# Altium schematic symbol library FPGA_Xilinx_Virtex7.SchLib: 34 symbols (part 12 of 34)
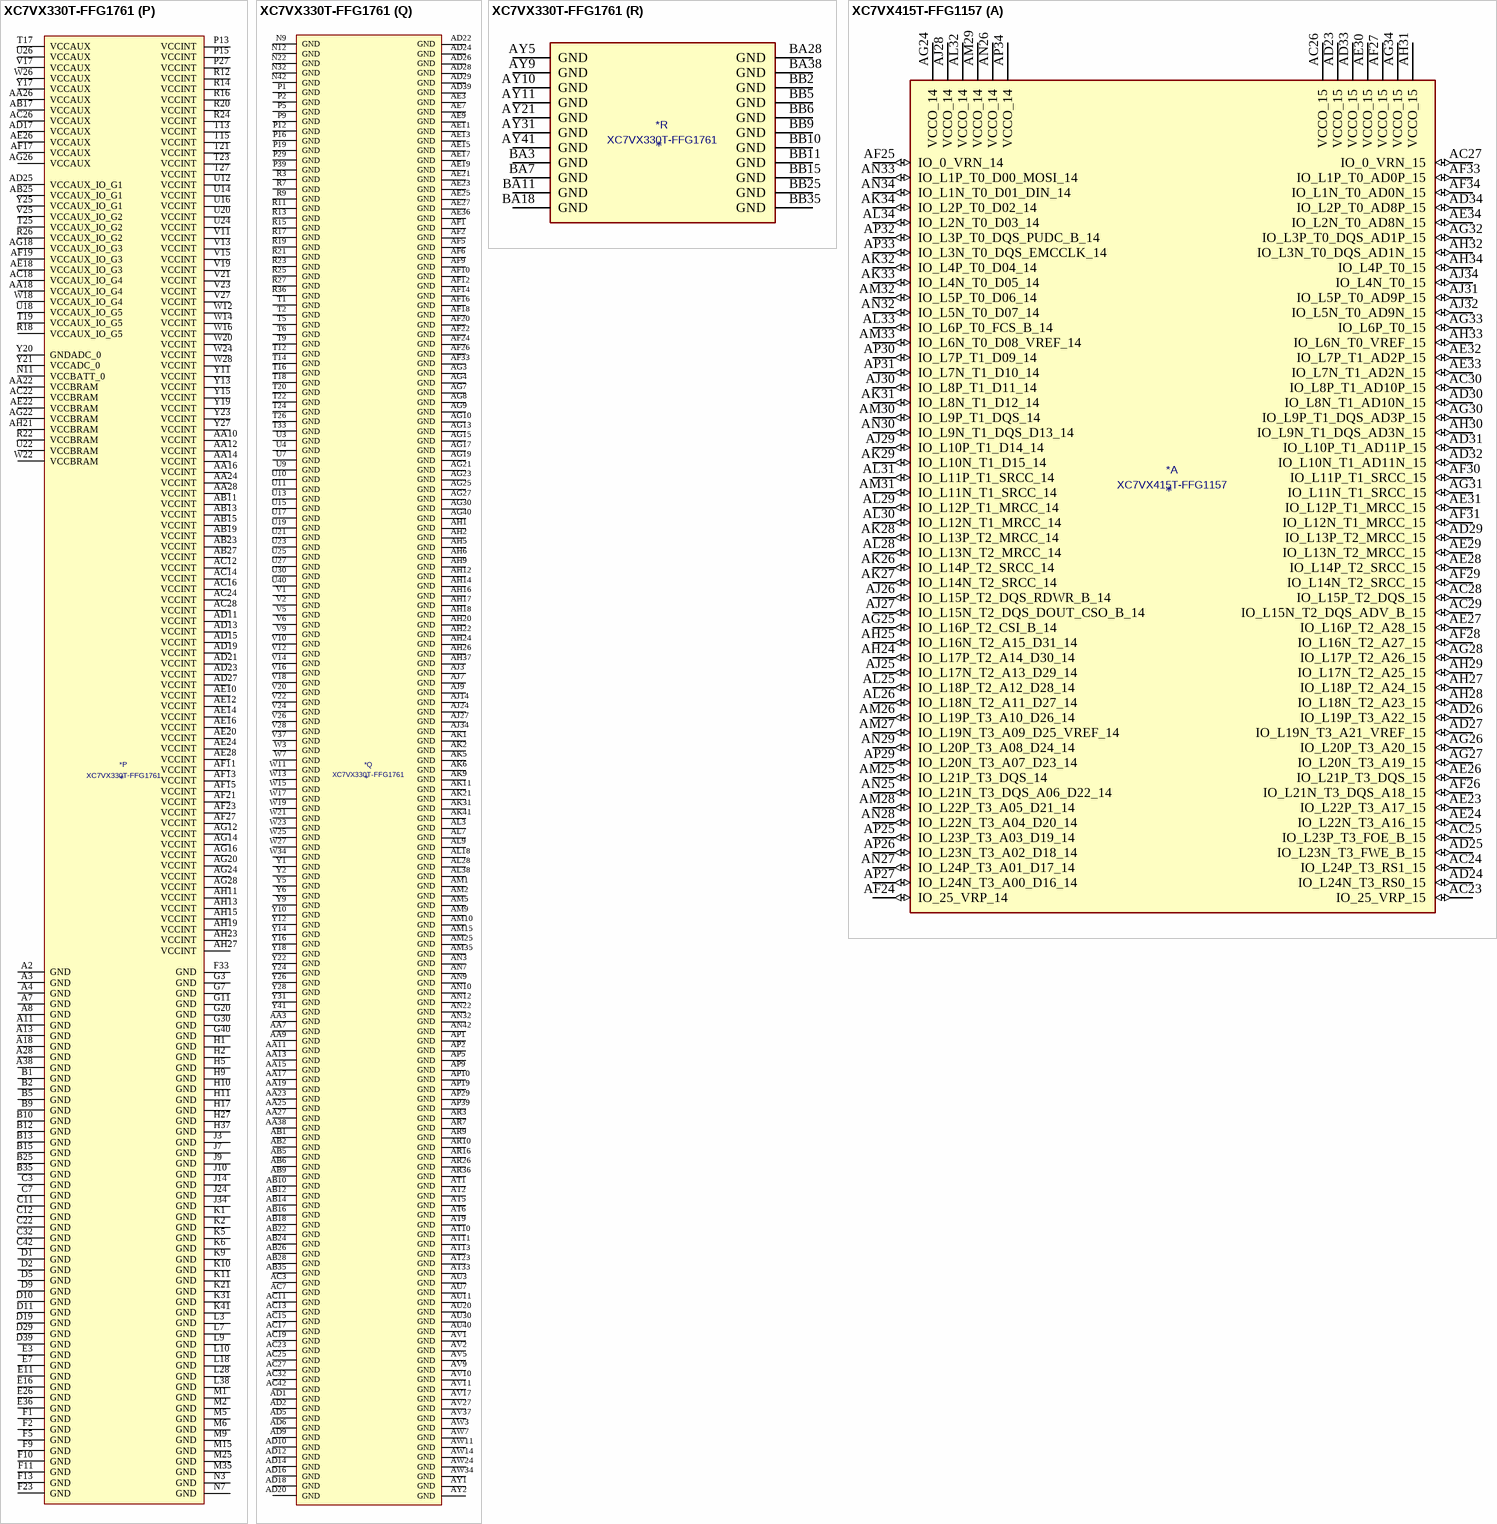
[diagram p183: symbols XC7VX330T-FFG1761 to XC7VX415T-FFG1157]

## XC7VX330T-FFG1761
designator *  value XC7VX330T-FFG1761
ki_keywords: FPGA; ki_description: Virtex 7 XT 330 XC7VX330T-FFG1761
part A pins: AK26 VCCO_12 (power), AN27 VCCO_12 (power), AN30 IO_L21P_T3_DQS_13 (io), AN31 IO_L23P_T3_13 (io), AP30 IO_L21N_T3_DQS_13 (io), AP31 IO_L23N_T3_13 (io), AP32 IO_L22P_T3_13 (io), AP33 IO_L24P_T3_13 (io), AP34 VCCO_13 (power), AR30 IO_L19P_T3_13 (io), AR31 VCCO_13 (power), AR32 IO_L22N_T3_13 (io), AR33 IO_L24N_T3_13 (io), AR34 IO_L10P_T1_13 (io), AR35 IO_0_13 (io), AT28 VCCO_12 (power), AT30 IO_L19N_T3_VREF_13 (io), AT31 IO_25_13 (io), AT32 IO_L9P_T1_DQS_13 (io), AT34 IO_L7P_T1_13 (io), AT35 IO_L10N_T1_13 (io), AT36 IO_L8P_T1_13 (io), AU25 VCCO_12 (power), AU31 IO_L20P_T3_13 (io), AU32 IO_L11P_T1_SRCC_13 (io), AU33 IO_L9N_T1_DQS_13 (io), AU34 IO_L7N_T1_13 (io), AU35 VCCO_13 (power), AU36 IO_L8N_T1_13 (io), AV30 IO_L18P_T2_13 (io), AV31 IO_L20N_T3_13 (io), AV32 VCCO_13 (power), AV33 IO_L11N_T1_SRCC_13 (io), AV34 IO_L13P_T2_MRCC_13 (io), AV35 IO_L13N_T2_MRCC_13 (io), AV36 IO_L2P_T0_13 (io), AW29 VCCO_12 (power), AW30 IO_L16P_T2_13 (io), AW31 IO_L18N_T2_13 (io), AW32 IO_L12P_T1_MRCC_13 (io), AW33 IO_L12N_T1_MRCC_13 (io), AW35 IO_L6P_T0_13 (io), AW36 IO_L2N_T0_13 (io), AY26 VCCO_12 (power), AY30 IO_L16N_T2_13 (io), AY32 IO_L14P_T2_SRCC_13 (io), AY33 IO_L14N_T2_SRCC_13 (io), AY34 IO_L1P_T0_13 (io), AY35 IO_L6N_T0_VREF_13 (io), AY36 VCCO_13 (power), BA30 IO_L17P_T2_13 (io), BA31 IO_L15P_T2_DQS_13 (io), BA32 IO_L15N_T2_DQS_13 (io), BA33 VCCO_13 (power), BA34 IO_L3P_T0_DQS_13 (io), BA35 IO_L1N_T0_13 (io), BA36 IO_L4P_T0_13 (io), BB30 VCCO_13 (power), BB31 IO_L17N_T2_13 (io), BB32 IO_L5P_T0_13 (io), BB33 IO_L5N_T0_13 (io), BB34 IO_L3N_T0_DQS_13 (io), BB36 IO_L4N_T0_13 (io)
part B pins: AF28 VCCO_14 (power), AF29 IO_L21P_T3_DQS_14 (io), AF30 IO_L23P_T3_A03_D19_14 (io), AG29 IO_L21N_T3_DQS_A06_D22_14 (io), AG31 IO_L23N_T3_A02_D18_14 (io), AG32 IO_25_VRP_14 (io), AG33 IO_L7P_T1_D09_14 (io), AH28 IO_L24P_T3_A01_D17_14 (io), AH29 IO_L19P_T3_A10_D26_14 (io), AH30 IO_L19N_T3_A09_D25_VREF_14 (io), AH31 IO_L9P_T1_DQS_14 (io), AH32 VCCO_14 (power), AH33 IO_L7N_T1_D10_14 (io), AH34 IO_L10P_T1_D14_14 (io), AH35 IO_0_VRN_14 (io), AJ28 IO_L24N_T3_A00_D16_14 (io), AJ29 VCCO_14 (power), AJ30 IO_L20P_T3_A08_D24_14 (io), AJ31 IO_L9N_T1_DQS_D13_14 (io), AJ32 IO_L13P_T2_MRCC_14 (io), AJ33 IO_L11P_T1_SRCC_14 (io), AJ35 IO_L10N_T1_D15_14 (io), AJ36 IO_L2P_T0_D02_14 (io), AJ37 IO_L2N_T0_D03_14 (io), AK28 IO_L22P_T3_A05_D21_14 (io), AK29 IO_L22N_T3_A04_D20_14 (io), AK30 IO_L20N_T3_A07_D23_14 (io), AK32 IO_L13N_T2_MRCC_14 (io), AK33 IO_L11N_T1_SRCC_14 (io), AK34 IO_L12P_T1_MRCC_14 (io), AK35 IO_L8P_T1_D11_14 (io), AK36 VCCO_14 (power), AK37 IO_L4P_T0_D04_14 (io), AL29 IO_L18P_T2_A12_D28_14 (io), AL30 IO_L18N_T2_A11_D27_14 (io), AL31 IO_L14P_T2_SRCC_14 (io), AL32 IO_L14N_T2_SRCC_14 (io), AL33 VCCO_14 (power), AL34 IO_L12N_T1_MRCC_14 (io), AL35 IO_L8N_T1_D12_14 (io), AL36 IO_L6P_T0_FCS_B_14 (io), AL37 IO_L4N_T0_D05_14 (io), AM30 VCCO_14 (power), AM31 IO_L16P_T2_CSI_B_14 (io), AM32 IO_L16N_T2_A15_D31_14 (io), AM33 IO_L17P_T2_A14_D30_14 (io), AM34 IO_L15P_T2_DQS_RDWR_B_14 (io), AM36 IO_L1P_T0_D00_MOSI_14 (io), AM37 IO_L6N_T0_D08_VREF_14 (io), AM38 IO_0_VRN_15 (io), AM39 IO_L6P_T0_15 (io), AM40 VCCO_15 (power), AM41 IO_L2P_T0_AD8P_15 (io), AM42 IO_L2N_T0_AD8N_15 (io), AN33 IO_L17N_T2_A13_D29_14 (io), AN34 IO_L15N_T2_DQS_DOUT_CSO_B_14 (io), AN35 IO_L5P_T0_D06_14 (io), AN36 IO_L1N_T0_D01_DIN_14 (io), AN37 VCCO_14 (power), AN38 IO_L1P_T0_AD0P_15 (io), AN39 IO_L6N_T0_VREF_15 (io), AN40 IO_L4P_T0_15 (io), AN41 IO_L4N_T0_15 (io), AP35 IO_L5N_T0_D07_14 (io), AP36 IO_L3P_T0_DQS_PUDC_B_14 (io), AP37 IO_L3N_T0_DQS_EMCCLK_14 (io), AP38 IO_L1N_T0_AD0N_15 (io), AP40 IO_L7P_T1_AD2P_15 (io), AP41 IO_L8P_T1_AD10P_15 (io), AP42 IO_L8N_T1_AD10N_15 (io), AR37 IO_L5P_T0_AD9P_15 (io), AR38 IO_L3P_T0_DQS_AD1P_15 (io), AR39 IO_L3N_T0_DQS_AD1N_15 (io), AR40 IO_L7N_T1_AD2N_15 (io), AR41 VCCO_15 (power), AR42 IO_L10P_T1_AD11P_15 (io), AT37 IO_L5N_T0_AD9N_15 (io), AT38 VCCO_15 (power), AT39 IO_L9P_T1_DQS_AD3P_15 (io), AT40 IO_L9N_T1_DQS_AD3N_15 (io), AT41 IO_L20P_T3_A20_15 (io), AT42 IO_L10N_T1_AD11N_15 (io), AU37 IO_25_VRP_15 (io), AU38 IO_L12P_T1_MRCC_15 (io), AU39 IO_L11P_T1_SRCC_15 (io), AU41 IO_L22P_T3_A17_15 (io), AU42 IO_L20N_T3_A19_15 (io), AV38 IO_L12N_T1_MRCC_15 (io), AV39 IO_L11N_T1_SRCC_15 (io), AV40 IO_L13P_T2_MRCC_15 (io), AV41 IO_L22N_T3_A16_15 (io), AV42 VCCO_15 (power), AW37 IO_L15P_T2_DQS_15 (io), AW38 IO_L17P_T2_A26_15 (io), AW39 VCCO_15 (power), AW40 IO_L13N_T2_MRCC_15 (io), AW41 IO_L24P_T3_RS1_15 (io), AW42 IO_L24N_T3_RS0_15 (io), AY37 IO_L15N_T2_DQS_ADV_B_15 (io), AY38 IO_L17N_T2_A25_15 (io), AY39 IO_L14P_T2_SRCC_15 (io), AY40 IO_L14N_T2_SRCC_15 (io), AY42 IO_L21P_T3_DQS_15 (io), BA37 IO_L16P_T2_A28_15 (io), BA39 IO_L19P_T3_A22_15 (io), BA40 IO_L19N_T3_A21_VREF_15 (io), BA41 IO_L23P_T3_FOE_B_15 (io), BA42 IO_L21N_T3_DQS_A18_15 (io), BB37 IO_L16N_T2_A27_15 (io), BB38 IO_L18P_T2_A24_15 (io), BB39 IO_L18N_T2_A23_15 (io), BB40 VCCO_15 (power), BB41 IO_L23N_T3_FWE_B_15 (io)
part C pins: AA29 IO_L23P_T3_16 (io), AA30 IO_L23N_T3_16 (io), AA31 IO_L21P_T3_DQS_16 (io), AA32 IO_L21N_T3_DQS_16 (io), AA33 VCCO_16 (power), AA34 IO_L10P_T1_16 (io), AA35 IO_L10N_T1_16 (io), AA36 IO_L8N_T1_16 (io), AA37 IO_L7N_T1_16 (io), AA39 IO_L3N_T0_DQS_17 (io), AA40 IO_L6P_T0_17 (io), AA41 IO_L6N_T0_VREF_17 (io), AA42 IO_L4N_T0_17 (io), AB29 IO_L24P_T3_16 (io), AB30 VCCO_16 (power), AB31 IO_L11P_T1_SRCC_16 (io), AB32 IO_L11N_T1_SRCC_16 (io), AB33 IO_L12P_T1_MRCC_16 (io), AB34 IO_25_VRP_16 (io), AB36 IO_L9P_T1_DQS_16 (io), AB37 IO_L9N_T1_DQS_16 (io), AB38 IO_L5P_T0_17 (io), AB39 IO_L5N_T0_17 (io), AB40 VCCO_17 (power), AB41 IO_L1P_T0_17 (io), AB42 IO_L1N_T0_17 (io), AC29 IO_L24N_T3_16 (io), AC30 IO_L22P_T3_16 (io), AC31 IO_L20P_T3_16 (io), AC33 IO_L12N_T1_MRCC_16 (io), AC34 IO_L14P_T2_SRCC_16 (io), AC35 IO_L5P_T0_16 (io), AC36 IO_L5N_T0_16 (io), AC37 VCCO_17 (power), AC38 IO_L7P_T1_17 (io), AC39 IO_L7N_T1_17 (io), AC40 IO_L10P_T1_17 (io), AC41 IO_L10N_T1_17 (io), AD30 IO_L22N_T3_16 (io), AD31 IO_L20N_T3_16 (io), AD32 IO_L13P_T2_MRCC_16 (io), AD33 IO_L13N_T2_MRCC_16 (io), AD34 VCCO_16 (power), AD35 IO_L14N_T2_SRCC_16 (io), AD36 IO_L4P_T0_16 (io), AD37 IO_L4N_T0_16 (io), AD38 IO_L9P_T1_DQS_17 (io), AD40 IO_L12P_T1_MRCC_17 (io), AD41 IO_L12N_T1_MRCC_17 (io), AD42 IO_L8P_T1_17 (io), AE29 IO_L18P_T2_16 (io), AE30 IO_L18N_T2_16 (io), AE31 VCCO_16 (power), AE32 IO_L15P_T2_DQS_16 (io), AE33 IO_L15N_T2_DQS_16 (io), AE34 IO_L17P_T2_16 (io), AE35 IO_L17N_T2_16 (io), AE37 IO_L2P_T0_16 (io), AE38 IO_L9N_T1_DQS_17 (io), AE39 IO_L11P_T1_SRCC_17 (io), AE40 IO_L11N_T1_SRCC_17 (io), AE41 VCCO_17 (power), AE42 IO_L8N_T1_17 (io), AF31 IO_L16P_T2_16 (io), AF32 IO_L16N_T2_16 (io), AF34 IO_L3P_T0_DQS_16 (io), AF35 IO_L1P_T0_16 (io), AF36 IO_L1N_T0_16 (io), AF37 IO_L2N_T0_16 (io), AF38 VCCO_17 (power), AF39 IO_L13P_T2_MRCC_17 (io), AF40 IO_L13N_T2_MRCC_17 (io), AF41 IO_L14P_T2_SRCC_17 (io), AF42 IO_L16P_T2_17 (io), AG34 IO_L3N_T0_DQS_16 (io), AG35 VCCO_16 (power), AG36 IO_L6P_T0_16 (io), AG37 IO_25_VRP_17 (io), AG38 IO_L17P_T2_17 (io), AG39 IO_L15P_T2_DQS_17 (io), AG41 IO_L14N_T2_SRCC_17 (io), AG42 IO_L16N_T2_17 (io), AH36 IO_L6N_T0_VREF_16 (io), AH38 IO_L17N_T2_17 (io), AH39 IO_L15N_T2_DQS_17 (io), AH40 IO_L20P_T3_17 (io), AH41 IO_L20N_T3_17 (io), AH42 VCCO_17 (power), AJ38 IO_L18P_T2_17 (io), AJ39 VCCO_17 (power), AJ40 IO_L22P_T3_17 (io), AJ41 IO_L22N_T3_17 (io), AJ42 IO_L24P_T3_17 (io), AK38 IO_L18N_T2_17 (io), AK39 IO_L23P_T3_17 (io), AK40 IO_L19P_T3_17 (io), AK42 IO_L24N_T3_17 (io), AL39 IO_L23N_T3_17 (io), AL40 IO_L19N_T3_VREF_17 (io), AL41 IO_L21P_T3_DQS_17 (io), AL42 IO_L21N_T3_DQS_17 (io), W40 IO_L2P_T0_17 (io), Y32 IO_L19P_T3_16 (io), Y33 IO_L19N_T3_VREF_16 (io), Y34 IO_0_VRN_16 (io), Y35 IO_L8P_T1_16 (io), Y36 VCCO_16 (power), Y37 IO_L7P_T1_16 (io), Y38 IO_0_VRN_17 (io), Y39 IO_L3P_T0_DQS_17 (io), Y40 IO_L2N_T0_17 (io), Y42 IO_L4P_T0_17 (io)
part D pins: A40 IO_L2P_T0_19 (io), A41 IO_L2N_T0_19 (io), B40 VCCO_19 (power), B41 IO_L4P_T0_19 (io), B42 IO_L4N_T0_19 (io), C40 IO_L6P_T0_19 (io), C41 IO_L6N_T0_VREF_19 (io), D40 IO_L1N_T0_19 (io), D41 IO_L3P_T0_DQS_19 (io), D42 IO_L3N_T0_DQS_19 (io), E40 IO_L1P_T0_19 (io), E41 VCCO_19 (power), E42 IO_L5N_T0_19 (io), F40 IO_L10P_T1_19 (io), F41 IO_L10N_T1_19 (io), F42 IO_L5P_T0_19 (io), G39 IO_L8N_T1_19 (io), G41 IO_L9P_T1_DQS_19 (io), G42 IO_L9N_T1_DQS_19 (io), H39 IO_L8P_T1_19 (io), H40 IO_L7P_T1_19 (io), H41 IO_L7N_T1_19 (io), H42 VCCO_19 (power), J39 VCCO_19 (power), J40 IO_L11P_T1_SRCC_19 (io), J41 IO_L11N_T1_SRCC_19 (io), J42 IO_L15N_T2_DQS_19 (io), K37 IO_L17P_T2_19 (io), K38 IO_L17N_T2_19 (io), K39 IO_L12P_T1_MRCC_19 (io), K40 IO_L12N_T1_MRCC_19 (io), K42 IO_L15P_T2_DQS_19 (io), L36 IO_0_VRN_19 (io), L37 IO_L18N_T2_19 (io), L39 IO_L13P_T2_MRCC_19 (io), L40 IO_L13N_T2_MRCC_19 (io), L41 IO_L14N_T2_SRCC_19 (io), L42 IO_L16N_T2_19 (io), M36 IO_L18P_T2_19 (io), M37 IO_L20P_T3_19 (io), M38 IO_L20N_T3_19 (io), M39 IO_L22N_T3_19 (io), M40 VCCO_19 (power), M41 IO_L14P_T2_SRCC_19 (io), M42 IO_L16P_T2_19 (io), N33 IO_L2P_T0_18 (io), N34 IO_L2N_T0_18 (io), N35 IO_0_VRN_18 (io), N36 IO_25_VRP_19 (io), N37 VCCO_19 (power), N38 IO_L22P_T3_19 (io), N39 IO_L24P_T3_19 (io), N40 IO_L24N_T3_19 (io), N41 IO_L19N_T3_VREF_19 (io), P32 IO_L6P_T0_18 (io), P33 IO_L6N_T0_VREF_18 (io), P34 VCCO_18 (power), P35 IO_L4P_T0_18 (io), P36 IO_L4N_T0_18 (io), P37 IO_L8P_T1_18 (io), P38 IO_L8N_T1_18 (io), P40 IO_L23N_T3_19 (io), P41 IO_L19P_T3_19 (io), P42 IO_L21N_T3_DQS_19 (io), R32 IO_L5N_T0_18 (io), R33 IO_L3P_T0_DQS_18 (io), R34 IO_L3N_T0_DQS_18 (io), R35 IO_L1N_T0_18 (io), R37 IO_L7N_T1_18 (io), R38 IO_L10P_T1_18 (io), R39 IO_L10N_T1_18 (io), R40 IO_L23P_T3_19 (io), R41 VCCO_19 (power), R42 IO_L21P_T3_DQS_19 (io), T32 IO_L5P_T0_18 (io), T34 IO_L1P_T0_18 (io), T35 IO_L9N_T1_DQS_18 (io), T36 IO_L7P_T1_18 (io), T37 IO_L13N_T2_MRCC_18 (io), T38 VCCO_18 (power), T39 IO_L12N_T1_MRCC_18 (io), T40 IO_L20P_T3_18 (io), T41 IO_L20N_T3_18 (io), T42 IO_L22N_T3_18 (io), U32 IO_L17P_T2_18 (io), U33 IO_L17N_T2_18 (io), U34 IO_L9P_T1_DQS_18 (io), U35 VCCO_18 (power), U36 IO_L13P_T2_MRCC_18 (io), U37 IO_L11P_T1_SRCC_18 (io), U38 IO_L11N_T1_SRCC_18 (io), U39 IO_L12P_T1_MRCC_18 (io), U41 IO_L22P_T3_18 (io), U42 IO_L24N_T3_18 (io), V32 VCCO_18 (power), V33 IO_L15P_T2_DQS_18 (io), V34 IO_L15N_T2_DQS_18 (io), V35 IO_L14P_T2_SRCC_18 (io), V36 IO_L14N_T2_SRCC_18 (io), V38 IO_L23N_T3_18 (io), V39 IO_L19P_T3_18 (io), V40 IO_L19N_T3_VREF_18 (io), V41 IO_L24P_T3_18 (io), V42 VCCO_18 (power), W32 IO_L18P_T2_18 (io), W33 IO_L18N_T2_18 (io), W35 IO_25_VRP_18 (io), W36 IO_L16P_T2_18 (io), W37 IO_L16N_T2_18 (io), W38 IO_L23P_T3_18 (io), W39 VCCO_18 (power), W41 IO_L21P_T3_DQS_18 (io), W42 IO_L21N_T3_DQS_18 (io)
part E pins: AJ19 VCCO_32 (power), AK16 VCCO_31 (power), AL13 VCCO_31 (power), AN17 VCCO_32 (power), AP14 VCCO_31 (power), AR11 VCCO_31 (power), AT18 VCCO_32 (power), AU15 VCCO_31 (power), AV12 VCCO_31 (power), AW19 VCCO_32 (power), AY16 VCCO_32 (power), BA13 VCCO_31 (power), BB20 VCCO_32 (power)
part F pins: AJ20 IO_L5N_T0_33 (io), AJ21 IO_L5P_T0_33 (io), AJ22 IO_L3P_T0_DQS_33 (io), AJ23 IO_L1P_T0_33 (io), AK20 IO_L2P_T0_33 (io), AK22 IO_L3N_T0_DQS_33 (io), AK23 IO_L1N_T0_33 (io), AL20 IO_L2N_T0_33 (io), AL21 IO_L4P_T0_33 (io), AL22 IO_L6P_T0_33 (io), AL23 VCCO_33 (power), AL24 IO_0_VRN_33 (io), AM20 VCCO_33 (power), AM21 IO_L4N_T0_33 (io), AM22 IO_L6N_T0_VREF_33 (io), AM23 IO_L8P_T1_33 (io), AM24 IO_L7P_T1_33 (io), AN20 IO_25_VRP_33 (io), AN21 IO_L10P_T1_33 (io), AN23 IO_L8N_T1_33 (io), AN24 IO_L7N_T1_33 (io), AP21 IO_L10N_T1_33 (io), AP22 IO_L9N_T1_DQS_33 (io), AP23 IO_L9P_T1_DQS_33 (io), AP24 VCCO_33 (power), AR21 VCCO_33 (power), AR22 IO_L11N_T1_SRCC_33 (io), AR23 IO_L11P_T1_SRCC_33 (io), AR24 IO_L16P_T2_33 (io), AT21 IO_L15P_T2_DQS_33 (io), AT22 IO_L12P_T1_MRCC_33 (io), AT24 IO_L16N_T2_33 (io), AU21 IO_L15N_T2_DQS_33 (io), AU22 IO_L12N_T1_MRCC_33 (io), AU23 IO_L13P_T2_MRCC_33 (io), AU24 IO_L18P_T2_33 (io), AV21 IO_L17P_T2_33 (io), AV22 VCCO_33 (power), AV23 IO_L13N_T2_MRCC_33 (io), AV24 IO_L18N_T2_33 (io), AW21 IO_L17N_T2_33 (io), AW22 IO_L14N_T2_SRCC_33 (io), AW23 IO_L14P_T2_SRCC_33 (io), AY22 IO_L19N_T3_VREF_33 (io), AY23 IO_L19P_T3_33 (io), AY24 IO_L22P_T3_33 (io), AY25 IO_L20P_T3_33 (io), BA21 IO_L23P_T3_33 (io), BA22 IO_L21P_T3_DQS_33 (io), BA23 VCCO_33 (power), BA24 IO_L22N_T3_33 (io), BA25 IO_L20N_T3_33 (io), BB21 IO_L23N_T3_33 (io), BB22 IO_L21N_T3_DQS_33 (io), BB23 IO_L24N_T3_33 (io), BB24 IO_L24P_T3_33 (io), H30 IO_L8N_T1_34 (io), H31 IO_L10N_T1_34 (io), H32 VCCO_34 (power), H34 IO_L6P_T0_34 (io), H35 IO_L6N_T0_VREF_34 (io), J30 IO_L8P_T1_34 (io), J31 IO_L10P_T1_34 (io), J32 IO_L2P_T0_34 (io), J33 IO_L2N_T0_34 (io), J35 IO_L1N_T0_34 (io), K29 IO_L7P_T1_34 (io), K30 IO_L7N_T1_34 (io), K32 IO_L12N_T1_MRCC_34 (io), K33 IO_L3P_T0_DQS_34 (io), K34 IO_L3N_T0_DQS_34 (io), K35 IO_L1P_T0_34 (io), L29 IO_L9P_T1_DQS_34 (io), L30 IO_L9N_T1_DQS_34 (io), L31 IO_L12P_T1_MRCC_34 (io), L32 IO_L11N_T1_SRCC_34 (io), L33 VCCO_34 (power), L34 IO_L4P_T0_34 (io), L35 IO_L4N_T0_34 (io), M28 IO_L15P_T2_DQS_34 (io), M29 IO_L15N_T2_DQS_34 (io), M30 VCCO_34 (power), M31 IO_L13N_T2_MRCC_34 (io), M32 IO_L11P_T1_SRCC_34 (io), M33 IO_L5P_T0_34 (io), M34 IO_L5N_T0_34 (io), N28 IO_L17P_T2_34 (io), N29 IO_L17N_T2_34 (io), N30 IO_L13P_T2_MRCC_34 (io), N31 IO_L14N_T2_SRCC_34 (io), P28 IO_L16N_T2_34 (io), P30 IO_L14P_T2_SRCC_34 (io), P31 IO_L18N_T2_34 (io), R28 IO_L16P_T2_34 (io), R29 IO_0_VRN_34 (io), R30 IO_L18P_T2_34 (io), R31 VCCO_34 (power), T28 VCCO_34 (power), T29 IO_L21P_T3_DQS_34 (io), T30 IO_L21N_T3_DQS_34 (io), T31 IO_L19N_T3_VREF_34 (io), U28 IO_25_VRP_34 (io), U29 IO_L23N_T3_34 (io), U31 IO_L19P_T3_34 (io), V29 IO_L23P_T3_34 (io), V30 IO_L20P_T3_34 (io), V31 IO_L20N_T3_34 (io), W29 VCCO_34 (power), W30 IO_L22P_T3_34 (io), W31 IO_L22N_T3_34 (io), Y29 IO_L24P_T3_34 (io), Y30 IO_L24N_T3_34 (io)
part G pins: A33 VCCO_35 (power), A34 IO_L2N_T0_AD12N_35 (io), A35 IO_L4P_T0_35 (io), A36 IO_L4N_T0_35 (io), A37 IO_L1N_T0_AD4N_35 (io), A39 IO_L3N_T0_DQS_AD5N_35 (io), B32 IO_L8P_T1_AD14P_35 (io), B33 IO_L8N_T1_AD14N_35 (io), B34 IO_L2P_T0_AD12P_35 (io), B36 IO_L1P_T0_AD4P_35 (io), B37 IO_L6P_T0_35 (io), B38 IO_L6N_T0_VREF_35 (io), B39 IO_L3P_T0_DQS_AD5P_35 (io), C33 IO_L10P_T1_AD15P_35 (io), C34 IO_L10N_T1_AD15N_35 (io), C35 IO_L12P_T1_MRCC_35 (io), C36 IO_L12N_T1_MRCC_35 (io), C37 VCCO_35 (power), C38 IO_L5P_T0_AD13P_35 (io), C39 IO_L5N_T0_AD13N_35 (io), D32 IO_L7N_T1_AD6N_35 (io), D33 IO_L9N_T1_DQS_AD7N_35 (io), D34 VCCO_35 (power), D35 IO_L11P_T1_SRCC_35 (io), D36 IO_L11N_T1_SRCC_35 (io), D37 IO_L14P_T2_SRCC_35 (io), D38 IO_L14N_T2_SRCC_35 (io), E31 VCCO_35 (power), E32 IO_L7P_T1_AD6P_35 (io), E33 IO_L9P_T1_DQS_AD7P_35 (io), E34 IO_L13P_T2_MRCC_35 (io), E35 IO_L13N_T2_MRCC_35 (io), E37 IO_L19P_T3_35 (io), E38 IO_L19N_T3_VREF_35 (io), E39 IO_L21N_T3_DQS_35 (io), F32 IO_L15N_T2_DQS_35 (io), F34 IO_L17P_T2_35 (io), F35 IO_L17N_T2_35 (io), F36 IO_L16P_T2_35 (io), F37 IO_L16N_T2_35 (io), F38 VCCO_35 (power), F39 IO_L21P_T3_DQS_35 (io), G21 IO_L4P_T0_36 (io), G22 IO_L4N_T0_36 (io), G23 IO_L6N_T0_VREF_36 (io), G24 IO_L1N_T0_36 (io), G25 VCCO_36 (power), G26 IO_L5P_T0_36 (io), G27 IO_L5N_T0_36 (io), G28 IO_L7P_T1_36 (io), G29 IO_L7N_T1_36 (io), G31 IO_0_VRN_35 (io), G32 IO_L15P_T2_DQS_35 (io), G33 IO_L18N_T2_35 (io), G34 IO_25_VRP_35 (io), G35 VCCO_35 (power), G36 IO_L20P_T3_35 (io), G37 IO_L20N_T3_35 (io), G38 IO_L23N_T3_35 (io), H21 IO_L2N_T0_36 (io), H22 VCCO_36 (power), H23 IO_L6P_T0_36 (io), H24 IO_L1P_T0_36 (io), H25 IO_L3P_T0_DQS_36 (io), H26 IO_L3N_T0_DQS_36 (io), H28 IO_L9P_T1_DQS_36 (io), H29 IO_L9N_T1_DQS_36 (io), H33 IO_L18P_T2_35 (io), H36 IO_L24N_T3_35 (io), H38 IO_L23P_T3_35 (io), J21 IO_L2P_T0_36 (io), J22 IO_L17N_T2_36 (io), J23 IO_L14N_T2_SRCC_36 (io), J25 IO_L12P_T1_MRCC_36 (io), J26 IO_L12N_T1_MRCC_36 (io), J27 IO_L10N_T1_36 (io), J28 IO_L8N_T1_36 (io), J29 VCCO_36 (power), J36 IO_L24P_T3_35 (io), J37 IO_L22P_T3_35 (io), J38 IO_L22N_T3_35 (io), K22 IO_L17P_T2_36 (io), K23 IO_L14P_T2_SRCC_36 (io), K24 IO_L11P_T1_SRCC_36 (io), K25 IO_L11N_T1_SRCC_36 (io), K26 VCCO_36 (power), K27 IO_L10P_T1_36 (io), K28 IO_L8P_T1_36 (io), K36 VCCO_35 (power), L21 IO_L18N_T2_36 (io), L22 IO_L15N_T2_DQS_36 (io), L23 VCCO_36 (power), L24 IO_L13N_T2_MRCC_36 (io), L25 IO_L16P_T2_36 (io), L26 IO_L16N_T2_36 (io), L27 IO_L24N_T3_36 (io), M21 IO_L18P_T2_36 (io), M22 IO_L15P_T2_DQS_36 (io), M23 IO_0_VRN_36 (io), M24 IO_L13P_T2_MRCC_36 (io), M26 IO_25_VRP_36 (io), M27 IO_L24P_T3_36 (io), N21 IO_L19N_T3_VREF_36 (io), N23 IO_L23P_T3_36 (io), N24 IO_L23N_T3_36 (io), N25 IO_L22P_T3_36 (io), N26 IO_L22N_T3_36 (io), N27 VCCO_36 (power), P21 IO_L19P_T3_36 (io), P22 IO_L21P_T3_DQS_36 (io), P23 IO_L21N_T3_DQS_36 (io), P24 VCCO_36 (power), P25 IO_L20P_T3_36 (io), P26 IO_L20N_T3_36 (io)
part H pins: A15 IO_L2N_T0_38 (io), A16 IO_L2P_T0_38 (io), A17 IO_L4N_T0_38 (io), A19 IO_L3N_T0_DQS_38 (io), A20 IO_L3P_T0_DQS_38 (io), A21 IO_L5N_T0_38 (io), A22 IO_L2N_T0_37 (io), A23 VCCO_37 (power), A24 IO_L1P_T0_37 (io), A25 IO_L1N_T0_37 (io), A26 IO_L3P_T0_DQS_37 (io), A27 IO_L3N_T0_DQS_37 (io), A29 IO_L17P_T2_37 (io), A30 IO_L17N_T2_37 (io), A31 IO_L16P_T2_37 (io), A32 IO_L16N_T2_37 (io), B17 IO_L4P_T0_38 (io), B18 IO_L6N_T0_VREF_38 (io), B19 IO_L1N_T0_38 (io), B20 VCCO_38 (power), B21 IO_L5P_T0_38 (io), B22 IO_L2P_T0_37 (io), B23 IO_L4N_T0_37 (io), B24 IO_L6N_T0_VREF_37 (io), B26 IO_L5P_T0_37 (io), B27 IO_L5N_T0_37 (io), B28 IO_L15P_T2_DQS_37 (io), B29 IO_L15N_T2_DQS_37 (io), B30 VCCO_37 (power), B31 IO_L18N_T2_37 (io), C17 VCCO_38 (power), C18 IO_L6P_T0_38 (io), C19 IO_L1P_T0_38 (io), C20 IO_L7N_T1_38 (io), C21 IO_L9N_T1_DQS_38 (io), C23 IO_L4P_T0_37 (io), C24 IO_L6P_T0_37 (io), C25 IO_L12P_T1_MRCC_37 (io), C26 IO_L12N_T1_MRCC_37 (io), C27 VCCO_37 (power), C28 IO_L14P_T2_SRCC_37 (io), C29 IO_L14N_T2_SRCC_37 (io), C30 IO_L20N_T3_37 (io), C31 IO_L18P_T2_37 (io), D17 IO_L10N_T1_38 (io), D18 IO_L10P_T1_38 (io), D20 IO_L7P_T1_38 (io), D21 IO_L9P_T1_DQS_38 (io), D22 IO_L10P_T1_37 (io), D23 IO_L10N_T1_37 (io), D24 VCCO_37 (power), D25 IO_L11P_T1_SRCC_37 (io), D26 IO_L11N_T1_SRCC_37 (io), D27 IO_L13P_T2_MRCC_37 (io), D28 IO_L13N_T2_MRCC_37 (io), D30 IO_L20P_T3_37 (io), D31 IO_L19N_T3_VREF_37 (io), E17 IO_L8N_T1_38 (io), E18 IO_L12N_T1_MRCC_38 (io), E19 IO_L12P_T1_MRCC_38 (io), E20 IO_L15N_T2_DQS_38 (io), E21 VCCO_37 (power), E22 IO_L8N_T1_37 (io), E23 IO_L7P_T1_37 (io), E24 IO_L7N_T1_37 (io), E25 IO_L9N_T1_DQS_37 (io), E27 IO_L21P_T3_DQS_37 (io), E28 IO_L21N_T3_DQS_37 (io), E29 IO_L22N_T3_37 (io), E30 IO_L19P_T3_37 (io), F17 IO_L8P_T1_38 (io), F18 VCCO_38 (power), F19 IO_L11N_T1_SRCC_38 (io), F20 IO_L15P_T2_DQS_38 (io), F21 IO_0_VRN_37 (io), F22 IO_L8P_T1_37 (io), F24 IO_25_VRP_37 (io), F25 IO_L9P_T1_DQS_37 (io), F26 IO_L23P_T3_37 (io), F27 IO_L23N_T3_37 (io), F28 VCCO_37 (power), F29 IO_L22P_T3_37 (io), F30 IO_L24P_T3_37 (io), F31 IO_L24N_T3_37 (io), G17 IO_L18N_T2_38 (io), G18 IO_L13N_T2_MRCC_38 (io), G19 IO_L11P_T1_SRCC_38 (io), H18 IO_L18P_T2_38 (io), H19 IO_L13P_T2_MRCC_38 (io), H20 IO_L17N_T2_38 (io), J17 IO_L16N_T2_38 (io), J18 IO_L14N_T2_SRCC_38 (io), J19 VCCO_38 (power), J20 IO_L17P_T2_38 (io), K17 IO_L16P_T2_38 (io), K18 IO_0_VRN_38 (io), K19 IO_L14P_T2_SRCC_38 (io), K20 IO_25_VRP_38 (io), L17 IO_L20N_T3_38 (io), L19 IO_L24N_T3_38 (io), L20 IO_L24P_T3_38 (io), M17 IO_L20P_T3_38 (io), M18 IO_L22N_T3_38 (io), M19 IO_L22P_T3_38 (io), M20 VCCO_38 (power), N17 VCCO_38 (power), N18 IO_L21N_T3_DQS_38 (io), N19 IO_L21P_T3_DQS_38 (io), N20 IO_L23N_T3_38 (io), P17 IO_L19N_T3_VREF_38 (io), P18 IO_L19P_T3_38 (io), P20 IO_L23P_T3_38 (io)
part I pins: A14 IO_L2N_T0_39 (io), B14 IO_L2P_T0_39 (io), B16 IO_L1N_T0_39 (io), C13 IO_L4N_T0_39 (io), C14 IO_L3N_T0_DQS_39 (io), C15 IO_L3P_T0_DQS_39 (io), C16 IO_L1P_T0_39 (io), D12 IO_L6N_T0_VREF_39 (io), D13 IO_L4P_T0_39 (io), D14 VCCO_39 (power), D15 IO_L5N_T0_39 (io), D16 IO_L5P_T0_39 (io), E12 IO_L6P_T0_39 (io), E13 IO_L8N_T1_39 (io), E14 IO_L8P_T1_39 (io), E15 IO_L7N_T1_39 (io), F12 IO_L10N_T1_39 (io), F14 IO_L11N_T1_SRCC_39 (io), F15 IO_L11P_T1_SRCC_39 (io), F16 IO_L7P_T1_39 (io), G12 IO_L10P_T1_39 (io), G13 IO_L12N_T1_MRCC_39 (io), G14 IO_L12P_T1_MRCC_39 (io), G15 VCCO_39 (power), G16 IO_L9N_T1_DQS_39 (io), H12 VCCO_39 (power), H13 IO_L14N_T2_SRCC_39 (io), H14 IO_L13N_T2_MRCC_39 (io), H15 IO_L13P_T2_MRCC_39 (io), H16 IO_L9P_T1_DQS_39 (io), J11 IO_25_VRP_39 (io), J12 IO_L15N_T2_DQS_39 (io), J13 IO_L14P_T2_SRCC_39 (io), J15 IO_L16N_T2_39 (io), J16 IO_0_VRN_39 (io), K12 IO_L15P_T2_DQS_39 (io), K13 IO_L17N_T2_39 (io), K14 IO_L17P_T2_39 (io), K15 IO_L16P_T2_39 (io), K16 VCCO_39 (power), L11 IO_L19N_T3_VREF_39 (io), L12 IO_L19P_T3_39 (io), L13 VCCO_39 (power), L14 IO_L20N_T3_39 (io), L15 IO_L18N_T2_39 (io), L16 IO_L18P_T2_39 (io), M11 IO_L24N_T3_39 (io), M12 IO_L24P_T3_39 (io), M13 IO_L22N_T3_39 (io), M14 IO_L20P_T3_39 (io), M16 IO_L21N_T3_DQS_39 (io), N13 IO_L22P_T3_39 (io), N14 IO_L23N_T3_39 (io), N15 IO_L23P_T3_39 (io), N16 IO_L21P_T3_DQS_39 (io), P14 VCCO_39 (power)
part J pins: AD3 MGTHRXN3_114 (io), AD4 MGTHRXP3_114 (io), AD7 MGTREFCLK0N_114 (io), AD8 MGTREFCLK0P_114 (io), AE5 MGTHRXN2_114 (io), AE6 MGTHRXP2_114 (io), AF3 MGTHRXN1_114 (io), AF4 MGTHRXP1_114 (io), AF7 MGTREFCLK1N_114 (io), AF8 MGTREFCLK1P_114 (io), AG1 MGTHTXN3_114 (io), AG2 MGTHTXP3_114 (io), AG5 MGTHRXN0_114 (io), AG6 MGTHRXP0_114 (io), AH3 MGTHTXN2_114 (io), AH4 MGTHTXP2_114 (io), AH7 MGTREFCLK0N_113 (io), AH8 MGTREFCLK0P_113 (io), AJ1 MGTHTXN1_114 (io), AJ2 MGTHTXP1_114 (io), AJ5 MGTHRXN3_113 (io), AJ6 MGTHRXP3_113 (io), AK3 MGTHTXN0_114 (io), AK4 MGTHTXP0_114 (io), AK7 MGTREFCLK1N_113 (io), AK8 MGTREFCLK1P_113 (io), AL1 MGTHTXN3_113 (io), AL2 MGTHTXP3_113 (io), AL5 MGTHRXN2_113 (io), AL6 MGTHRXP2_113 (io), AM3 MGTHTXN2_113 (io), AM4 MGTHTXP2_113 (io), AM7 MGTHRXN1_113 (io), AM8 MGTHRXP1_113 (io), AN1 MGTHTXN1_113 (io), AN2 MGTHTXP1_113 (io), AN5 MGTHRXN0_113 (io), AN6 MGTHRXP0_113 (io), AP3 MGTHTXN0_113 (io), AP4 MGTHTXP0_113 (io)
part K pins: AA1 MGTHTXN2_115 (io), AA2 MGTHTXP2_115 (io), AA5 MGTHRXN2_115 (io), AA6 MGTHRXP2_115 (io), AB3 MGTHRXN1_115 (io), AB4 MGTHRXP1_115 (io), AB7 MGTREFCLK1N_115 (io), AB8 MGTREFCLK1P_115 (io), AC1 MGTHTXN1_115 (io), AC2 MGTHTXP1_115 (io), AC5 MGTHRXN0_115 (io), AC6 MGTHRXP0_115 (io), AE1 MGTHTXN0_115 (io), AE2 MGTHTXP0_115 (io), P3 MGTHTXN3_116 (io), P4 MGTHTXP3_116 (io), R1 MGTHTXN2_116 (io), R2 MGTHTXP2_116 (io), R5 MGTHRXN3_116 (io), R6 MGTHRXP3_116 (io), T3 MGTHTXN1_116 (io), T4 MGTHTXP1_116 (io), T7 MGTREFCLK0N_116 (io), T8 MGTREFCLK0P_116 (io), U1 MGTHTXN0_116 (io), U2 MGTHTXP0_116 (io), U5 MGTHRXN2_116 (io), U6 MGTHRXP2_116 (io), V3 MGTHRXN1_116 (io), V4 MGTHRXP1_116 (io), V7 MGTREFCLK1N_116 (io), V8 MGTREFCLK1P_116 (io), W1 MGTHTXN3_115 (io), W2 MGTHTXP3_115 (io), W5 MGTHRXN0_116 (io), W6 MGTHRXP0_116 (io), Y3 MGTHRXN3_115 (io), Y4 MGTHRXP3_115 (io), Y7 MGTREFCLK0N_115 (io), Y8 MGTREFCLK0P_115 (io)